# Altium footprint library TelemetriaGPRS-V3.PcbLib: 48 footprints (part 1 of 3)
Each footprint in its own frame and in the unit in brackets; x right, y up, seen from the top. Pads: shape width x height; smd on the part's side, far side on the other; paste and mask are expansions set on the pad; w line width, h text height; cw(c..) or ccw(c..) is an arc to the next point about the centre after c.
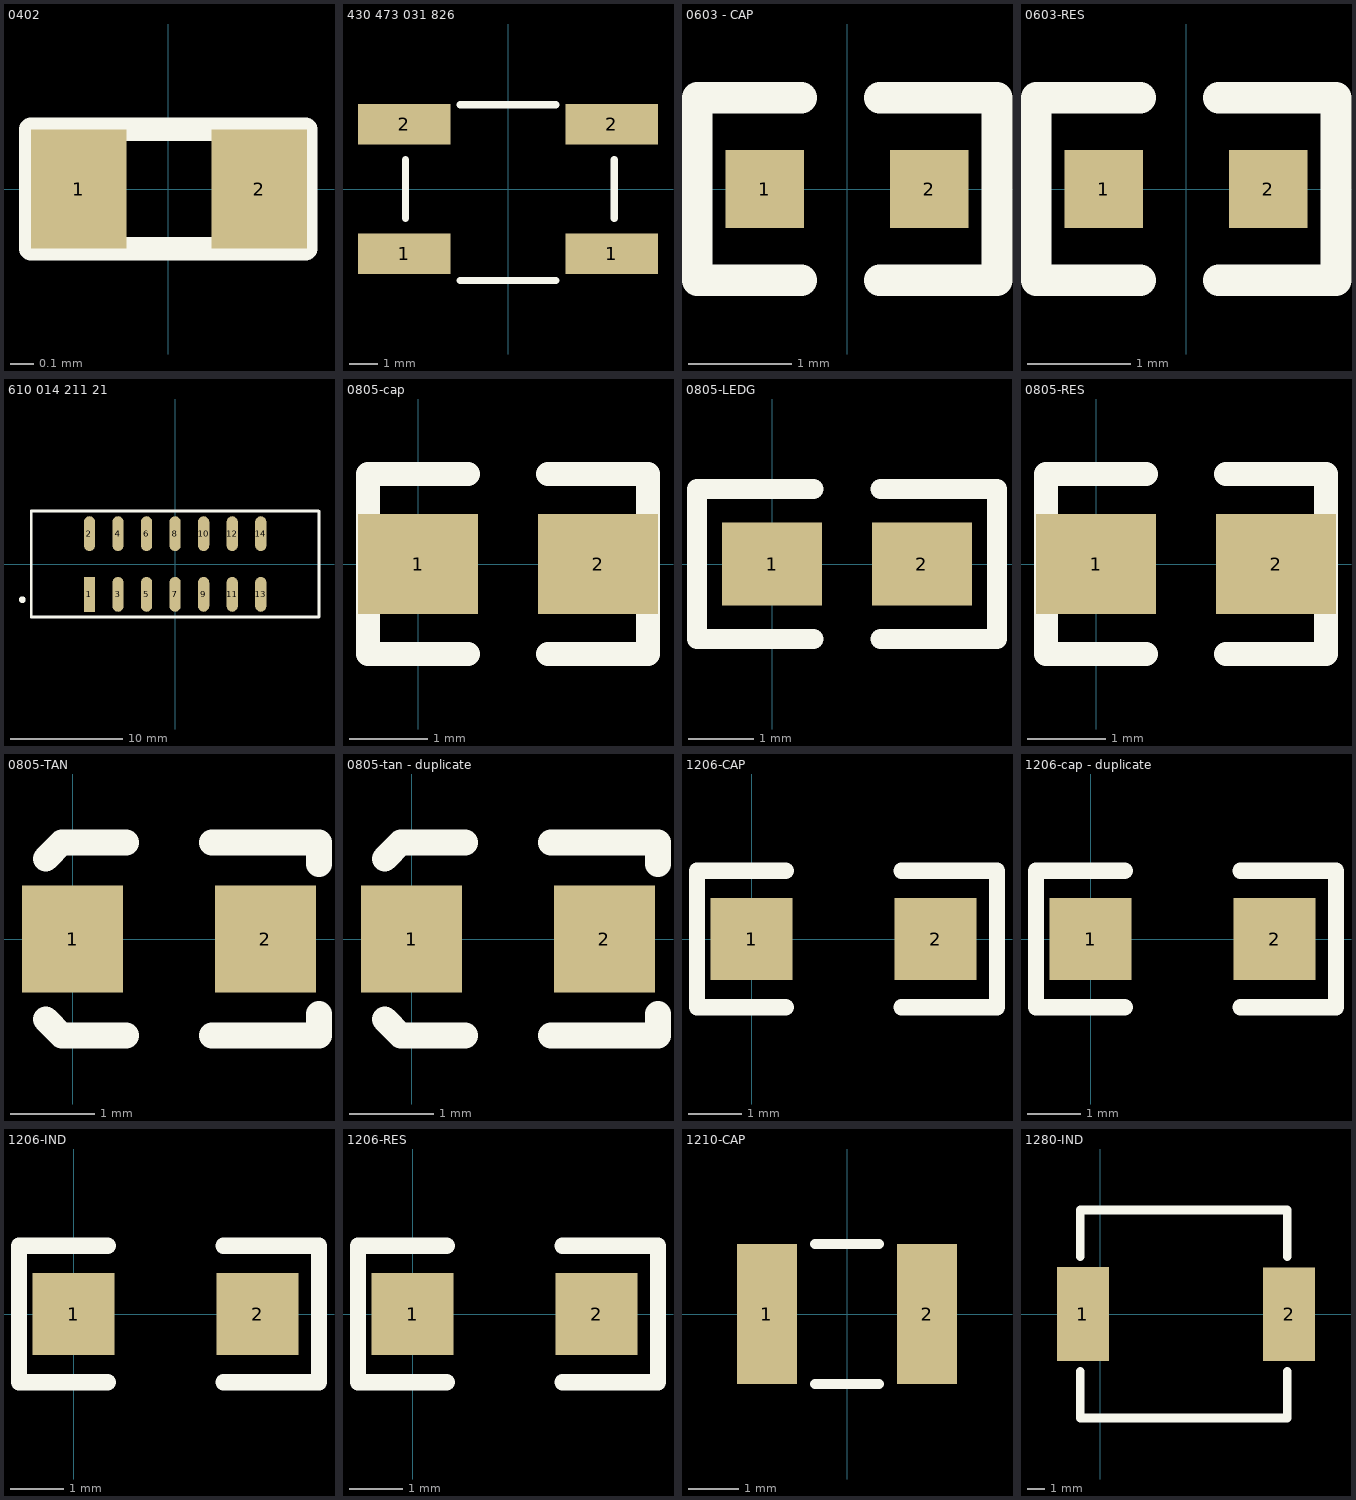
[diagram p0: the footprints below, top view; thin cyan lines are the x and y axes]

## 0402 [mm]
pads (2):
  rect 0.4x0.5 smd: 1(-0.375,0) 2(0.381,0)
Top Overlay:
  lines w0.1: -0.575,-0.25 -0.575,0 -0.575,0.25 0.575,0.25 0.575,-0.25 -0.575,-0.25

## 430 473 031 826 [mm] "6x6 mm SMD J-Bend washable WS-TASV White"
pads (4):
  rect 3.2x1.4 smd: 1(-3.6,-2.25) 1(3.6,-2.25) 2(-3.6,2.25) 2(3.6,2.25)
Top Overlay:
  lines w0.254: -3.556,-1.016 -3.556,1.016 ; -1.651,-3.175 1.651,-3.175 ; -1.651,2.921 1.651,2.921 ; 3.683,-1.016 3.683,1.016
3D body: height 3.1, standoff 0, extent -3.473,-3.1 3.727,3.1

## 0603 - CAP [mil]
height 104.33
pads (2):
  rect 30x30 smd: 1(-31.5,0) 2(31.5,0)
Top Overlay:
  lines w12: -17.5,-35 -57.5,-35 -57.5,35 -17.5,35 ; 12.5,-35 57.5,-35 57.5,35 12.5,35
3D body: height 11.89, standoff 0, extent -33.99,-15 29,16.49

## 0603-RES [mil]
height 104.33
pads (2):
  rect 30x30 smd: 1(-31.5,0) 2(31.5,0)
Top Overlay:
  lines w12: -17.5,-35 -57.5,-35 -57.5,35 -17.5,35 ; 12.5,-35 57.5,-35 57.5,35 12.5,35
3D body: height 17.72, standoff 0, extent -33.99,-16.14 29,16.15

## 610 014 211 21 [mm] "2.54mm SMT Dual Pin Header WR-PHD"
pads (15):
  round 0.6 on Top Overlay: 1(-13.589,-3.175)
  rect 1x3.1 smd: 1(-7.62,-2.7)
  oval 1x3.1 smd: 2(-7.62,2.7) 3(-5.08,-2.7) 4(-5.08,2.7) 5(-2.54,-2.7) 6(-2.54,2.7) 7(0,-2.7) 8(0,2.7) 9(2.54,-2.7) 10(2.54,2.7) 11(5.08,-2.7) 12(5.08,2.7) 13(7.62,-2.7) 14(7.62,2.7)
Top Overlay:
  lines w0.254: 12.757,4.7 -12.8,4.7 -12.8,-4.7 12.8,-4.7 12.8,4.698
3D body: height 9.57, standoff -0.03, extent -8.89,-4.004 8.89,3.496

## 0805-cap [mil]
height 104.33
pads (2):
  rect 60x50 smd: 1(0,0) 2(90,0)
Top Overlay:
  lines w12: 25,-45 -25,-45 -25,45 25,45 ; 65,-45 115,-45 115,45 65,45
3D body: height 30.79, standoff 0, extent 5.63,-25.01 84.37,24.21

## 0805-LEDG [mil]
height 104.33
pads (2):
  rect 60x50 smd: 1(0,0) 2(90,0)
Top Overlay:
  lines w12: 25,-45 -45,-45 -45,45 25,45 ; 65,-45 135,-45 135,45 65,45
3D body: height -47.24, standoff -90.55, extent 5.24,-25 84.76,24.21

## 0805-RES [mil]
height 104.33
pads (2):
  rect 60x50 smd: 1(0,0) 2(90,0)
Top Overlay:
  lines w12: 25,-45 -25,-45 -25,45 25,45 ; 65,-45 115,-45 115,45 65,45
3D body: height 29.92, standoff 0, extent -0.27,-26.57 90.28,26.58

## 0805-TAN [mm]
height 2.65
pads (2):
  rect 1.2x1.27 smd: 1(0,0) 2(2.286,0)
Top Overlay:
  lines w0.305: -0.318,-0.953 -0.127,-1.143 0.635,-1.143 ; -0.318,0.953 -0.127,1.143 0.635,1.143 ; 1.651,-1.143 2.921,-1.143 2.921,-0.889 ; 1.651,1.143 2.921,1.143 2.921,0.889
3D body: height 1.35, standoff 0, extent 0.018,-0.635 2.268,0.715

## 0805-tan - duplicate [mm]
pads (2):
  rect 1.2x1.27 smd: 1(0,0) 2(2.286,0)
Top Overlay:
  lines w0.305: -0.318,-0.953 -0.127,-1.143 0.635,-1.143 ; -0.318,0.953 -0.127,1.143 0.635,1.143 ; 1.651,-1.143 2.921,-1.143 2.921,-0.889 ; 1.651,1.143 2.921,1.143 2.921,0.889
3D body: height 1.35, standoff 0, extent 0.018,-0.635 2.268,0.715

## 1206-CAP [mil]
height 104.33
pads (2):
  rect 60x60 smd: 1(0,0) 2(135,0)
Top Overlay:
  lines w12: 25,-50 -40,-50 -40,50 25,50 ; 110,-50 180,-50 180,50 110,50
3D body: height 62.99, standoff 0, extent 7.01,-30 132.99,33

## 1206-cap - duplicate [mil]
pads (2):
  rect 60x60 smd: 1(0,0) 2(135,0)
Top Overlay:
  lines w12: 25,-50 -40,-50 -40,50 25,50 ; 110,-50 180,-50 180,50 110,50
3D body: height 62.99, standoff 0, extent 7.01,-30 132.99,33

## 1206-IND [mil]
height 104.33
pads (2):
  rect 60x60 smd: 1(0,0) 2(135,0)
Top Overlay:
  lines w12: 25,-50 -40,-50 -40,50 25,50 ; 110,-50 180,-50 180,50 110,50
3D body: height 42.91, standoff -0.39, extent 2.01,-31.5 127.99,31.5

## 1206-RES [mil]
height 104.33
pads (2):
  rect 60x60 smd: 1(0,0) 2(135,0)
Top Overlay:
  lines w12: 25,-50 -40,-50 -40,50 25,50 ; 110,-50 180,-50 180,50 110,50
3D body: height 33.46, standoff 0, extent -0.95,-34.05 130.94,34.05

## 1210-CAP [mm]
pads (2):
  rect 1.2x2.8 smd: 1(-1.6,0) 2(1.6,0)
Top Overlay:
  lines w0.2: -0.635,-1.397 0.635,-1.397 ; -0.635,1.397 0.635,1.397
3D body: height 2.5, standoff 0, extent -1.6,-1.25 1.6,1.25

## 1280-IND [mm]
pads (2):
  rect 3x5.4 smd: 1(-1,0) 2(10.9,-0.009)
Top Overlay:
  lines w0.5: -1.143,-3.302 -1.143,-6 10.795,-6 10.795,-3.302 ; -1.143,3.302 -1.143,6 10.795,6 10.795,3.302
3D body: height 7.95, standoff -0.05, extent -1.174,-6 10.826,6